# Altium schematic symbol library MCU_ST_STM32F4.SchLib: 300 symbols (part 3 of 10)
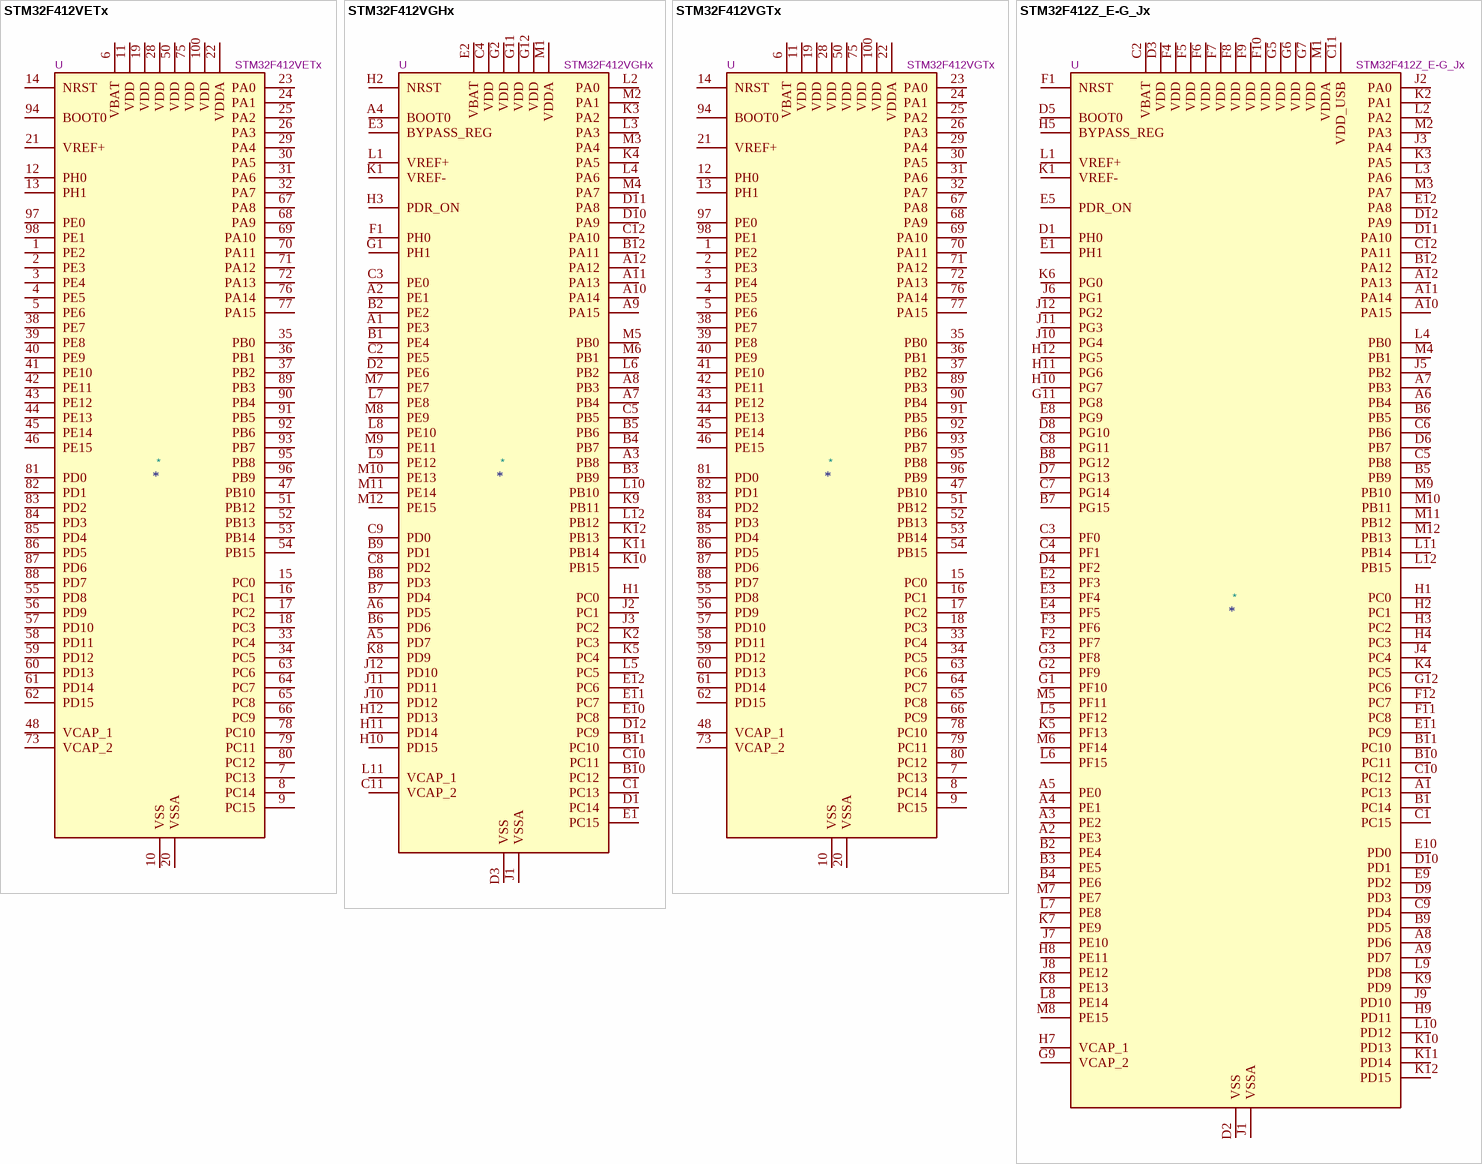
[diagram p78: symbols STM32F412VETx to STM32F412Z_E-G_Jx]

## STM32F412Z_E-G_Jx
designator *  value STM32F412Z_E-G_Jx  Reference: U
ki_keywords: Arm Cortex-M4 STM32F4 STM32F412; ki_description: STMicroelectronics Arm Cortex-M4 MCU, 512-1024KB flash, 256KB RAM, 100 MHz, 1.7-3.6V, 114 GPIO, UFBGA144; ki_fp_filters: *UFBGA*10x10mm*Layout12x12*P0.8mm*; Footprint: Package_BGA:UFBGA-144_10x10mm_Layout12x12_P0.8mm; Datasheet: https://www.st.com/resource/en/datasheet/stm32f412ze.pdf
pins: A1 PC13, A2 PE3, A3 PE2, A4 PE1, A5 PE0, A6 PB4, A7 PB3, A8 PD6, A9 PD7, A10 PA15, A11 PA14, A12 PA13, B1 PC14, B2 PE4, B3 PE5, B4 PE6, B5 PB9, B6 PB5, B7 PG15, B8 PG12, B9 PD5, B10 PC11, B11 PC10, B12 PA12, C1 PC15, C2 VBAT, C3 PF0, C4 PF1, C5 PB8, C6 PB6, C7 PG14, C8 PG11, C9 PD4, C10 PC12, C11 VDD_USB, C12 PA11, D1 PH0, D2 VSS, D3 VDD, D4 PF2, D5 BOOT0, D6 PB7, D7 PG13, D8 PG10, D9 PD3, D10 PD1, D11 PA10, D12 PA9, E1 PH1, E2 PF3, E3 PF4, E4 PF5, E5 PDR_ON, E6 VSS hidden, E7 VSS hidden, E8 PG9, E9 PD2, E10 PD0, E11 PC9, E12 PA8, F1 NRST, F2 PF7, F3 PF6, F4 VDD, F5 VDD, F6 VDD, F7 VDD, F8 VDD, F9 VDD, F10 VDD, F11 PC8, F12 PC7, G1 PF10, G2 PF9, G3 PF8, G4 VSS hidden, G5 VDD, G6 VDD, G7 VDD, G8 VSS hidden, G9 VCAP_2, G10 VSS hidden, G11 PG8, G12 PC6, H1 PC0, H2 PC1, H3 PC2, H4 PC3, H5 BYPASS_REG, H6 VSS hidden, H7 VCAP_1, H8 PE11, H9 PD11, H10 PG7, H11 PG6, H12 PG5, J1 VSSA, J2 PA0, J3 PA4, J4 PC4, J5 PB2, J6 PG1, J7 PE10, J8 PE12, J9 PD10, J10 PG4, J11 PG3, J12 PG2, K1 VREF-, K2 PA1, K3 PA5, K4 PC5, K5 PF13, K6 PG0, K7 PE9, K8 PE13, K9 PD9, K10 PD13, K11 PD14, K12 PD15, L1 VREF+, L2 PA2, L3 PA6, L4 PB0, L5 PF12, L6 PF15, L7 PE8, L8 PE14, L9 PD8, L10 PD12, L11 PB14, L12 PB15, M1 VDDA, M2 PA3, M3 PA7, M4 PB1, M5 PF11, M6 PF14, M7 PE7, M8 PE15, M9 PB10, M10 PB11, M11 PB12, M12 PB13

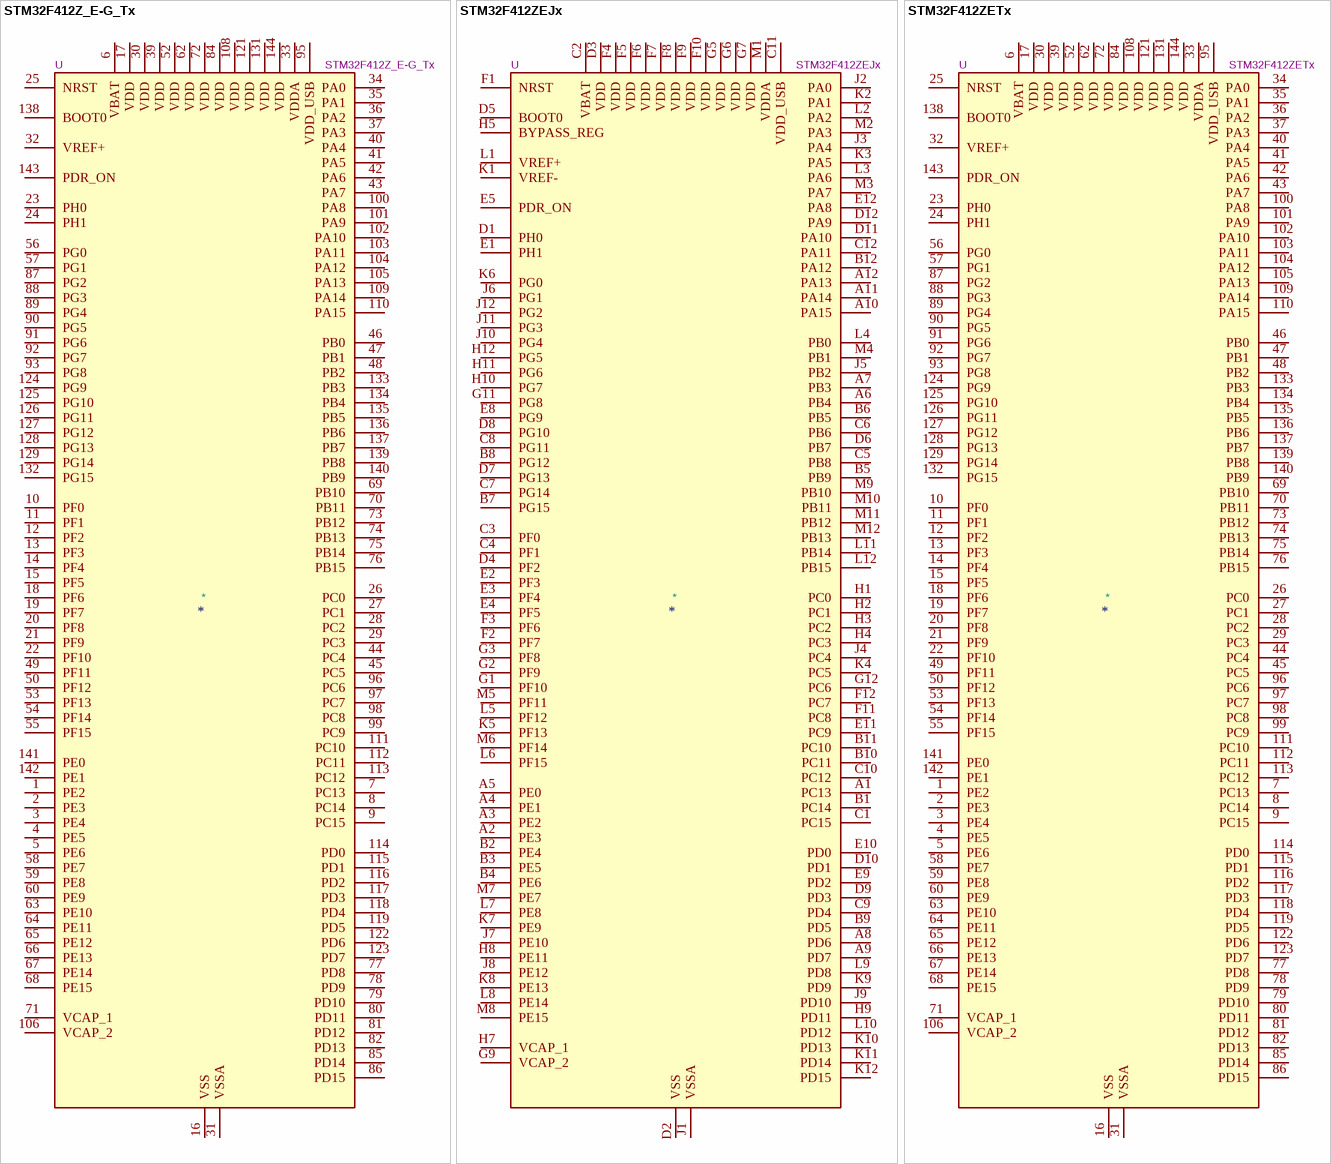
[diagram p16: symbols STM32F412Z_E-G_Tx to STM32F412ZETx]

## STM32F412Z_E-G_Tx
designator *  value STM32F412Z_E-G_Tx  Reference: U
ki_keywords: Arm Cortex-M4 STM32F4 STM32F412; ki_description: STMicroelectronics Arm Cortex-M4 MCU, 512-1024KB flash, 256KB RAM, 100 MHz, 1.7-3.6V, 114 GPIO, LQFP144; ki_fp_filters: LQFP*20x20mm*P0.5mm*; Footprint: Package_QFP:LQFP-144_20x20mm_P0.5mm; Datasheet: https://www.st.com/resource/en/datasheet/stm32f412ze.pdf
pins: 1 PE2, 2 PE3, 3 PE4, 4 PE5, 5 PE6, 6 VBAT, 7 PC13, 8 PC14, 9 PC15, 10 PF0, 11 PF1, 12 PF2, 13 PF3, 14 PF4, 15 PF5, 16 VSS, 17 VDD, 18 PF6, 19 PF7, 20 PF8, 21 PF9, 22 PF10, 23 PH0, 24 PH1, 25 NRST, 26 PC0, 27 PC1, 28 PC2, 29 PC3, 30 VDD, 31 VSSA, 32 VREF+, 33 VDDA, 34 PA0, 35 PA1, 36 PA2, 37 PA3, 38 VSS hidden, 39 VDD, 40 PA4, 41 PA5, 42 PA6, 43 PA7, 44 PC4, 45 PC5, 46 PB0, 47 PB1, 48 PB2, 49 PF11, 50 PF12, 51 VSS hidden, 52 VDD, 53 PF13, 54 PF14, 55 PF15, 56 PG0, 57 PG1, 58 PE7, 59 PE8, 60 PE9, 61 VSS hidden, 62 VDD, 63 PE10, 64 PE11, 65 PE12, 66 PE13, 67 PE14, 68 PE15, 69 PB10, 70 PB11, 71 VCAP_1, 72 VDD, 73 PB12, 74 PB13, 75 PB14, 76 PB15, 77 PD8, 78 PD9, 79 PD10, 80 PD11, 81 PD12, 82 PD13, 83 VSS hidden, 84 VDD, 85 PD14, 86 PD15, 87 PG2, 88 PG3, 89 PG4, 90 PG5, 91 PG6, 92 PG7, 93 PG8, 94 VSS hidden, 95 VDD_USB, 96 PC6, 97 PC7, 98 PC8, 99 PC9, 100 PA8, 101 PA9, 102 PA10, 103 PA11, 104 PA12, 105 PA13, 106 VCAP_2, 107 VSS hidden, 108 VDD, 109 PA14, 110 PA15, 111 PC10, 112 PC11, 113 PC12, 114 PD0, 115 PD1, 116 PD2, 117 PD3, 118 PD4, 119 PD5, 120 VSS hidden, 121 VDD, 122 PD6, 123 PD7, 124 PG9, 125 PG10, 126 PG11, 127 PG12, 128 PG13, 129 PG14, 130 VSS hidden, 131 VDD, 132 PG15, 133 PB3, 134 PB4, 135 PB5, 136 PB6, 137 PB7, 138 BOOT0, 139 PB8, 140 PB9, 141 PE0, 142 PE1, 143 PDR_ON, 144 VDD

## STM32F412ZEJx
designator *  value STM32F412ZEJx  Reference: U
ki_keywords: Arm Cortex-M4 STM32F4 STM32F412; ki_description: STMicroelectronics Arm Cortex-M4 MCU, 512KB flash, 256KB RAM, 100 MHz, 1.7-3.6V, 114 GPIO, UFBGA144; ki_fp_filters: *UFBGA*10x10mm*Layout12x12*P0.8mm*; Footprint: Package_BGA:UFBGA-144_10x10mm_Layout12x12_P0.8mm; Datasheet: https://www.st.com/resource/en/datasheet/stm32f412ze.pdf
pins: A1 PC13, A2 PE3, A3 PE2, A4 PE1, A5 PE0, A6 PB4, A7 PB3, A8 PD6, A9 PD7, A10 PA15, A11 PA14, A12 PA13, B1 PC14, B2 PE4, B3 PE5, B4 PE6, B5 PB9, B6 PB5, B7 PG15, B8 PG12, B9 PD5, B10 PC11, B11 PC10, B12 PA12, C1 PC15, C2 VBAT, C3 PF0, C4 PF1, C5 PB8, C6 PB6, C7 PG14, C8 PG11, C9 PD4, C10 PC12, C11 VDD_USB, C12 PA11, D1 PH0, D2 VSS, D3 VDD, D4 PF2, D5 BOOT0, D6 PB7, D7 PG13, D8 PG10, D9 PD3, D10 PD1, D11 PA10, D12 PA9, E1 PH1, E2 PF3, E3 PF4, E4 PF5, E5 PDR_ON, E6 VSS hidden, E7 VSS hidden, E8 PG9, E9 PD2, E10 PD0, E11 PC9, E12 PA8, F1 NRST, F2 PF7, F3 PF6, F4 VDD, F5 VDD, F6 VDD, F7 VDD, F8 VDD, F9 VDD, F10 VDD, F11 PC8, F12 PC7, G1 PF10, G2 PF9, G3 PF8, G4 VSS hidden, G5 VDD, G6 VDD, G7 VDD, G8 VSS hidden, G9 VCAP_2, G10 VSS hidden, G11 PG8, G12 PC6, H1 PC0, H2 PC1, H3 PC2, H4 PC3, H5 BYPASS_REG, H6 VSS hidden, H7 VCAP_1, H8 PE11, H9 PD11, H10 PG7, H11 PG6, H12 PG5, J1 VSSA, J2 PA0, J3 PA4, J4 PC4, J5 PB2, J6 PG1, J7 PE10, J8 PE12, J9 PD10, J10 PG4, J11 PG3, J12 PG2, K1 VREF-, K2 PA1, K3 PA5, K4 PC5, K5 PF13, K6 PG0, K7 PE9, K8 PE13, K9 PD9, K10 PD13, K11 PD14, K12 PD15, L1 VREF+, L2 PA2, L3 PA6, L4 PB0, L5 PF12, L6 PF15, L7 PE8, L8 PE14, L9 PD8, L10 PD12, L11 PB14, L12 PB15, M1 VDDA, M2 PA3, M3 PA7, M4 PB1, M5 PF11, M6 PF14, M7 PE7, M8 PE15, M9 PB10, M10 PB11, M11 PB12, M12 PB13

## STM32F412ZETx
designator *  value STM32F412ZETx  Reference: U
ki_keywords: Arm Cortex-M4 STM32F4 STM32F412; ki_description: STMicroelectronics Arm Cortex-M4 MCU, 512KB flash, 256KB RAM, 100 MHz, 1.7-3.6V, 114 GPIO, LQFP144; ki_fp_filters: LQFP*20x20mm*P0.5mm*; Footprint: Package_QFP:LQFP-144_20x20mm_P0.5mm; Datasheet: https://www.st.com/resource/en/datasheet/stm32f412ze.pdf
pins: 1 PE2, 2 PE3, 3 PE4, 4 PE5, 5 PE6, 6 VBAT, 7 PC13, 8 PC14, 9 PC15, 10 PF0, 11 PF1, 12 PF2, 13 PF3, 14 PF4, 15 PF5, 16 VSS, 17 VDD, 18 PF6, 19 PF7, 20 PF8, 21 PF9, 22 PF10, 23 PH0, 24 PH1, 25 NRST, 26 PC0, 27 PC1, 28 PC2, 29 PC3, 30 VDD, 31 VSSA, 32 VREF+, 33 VDDA, 34 PA0, 35 PA1, 36 PA2, 37 PA3, 38 VSS hidden, 39 VDD, 40 PA4, 41 PA5, 42 PA6, 43 PA7, 44 PC4, 45 PC5, 46 PB0, 47 PB1, 48 PB2, 49 PF11, 50 PF12, 51 VSS hidden, 52 VDD, 53 PF13, 54 PF14, 55 PF15, 56 PG0, 57 PG1, 58 PE7, 59 PE8, 60 PE9, 61 VSS hidden, 62 VDD, 63 PE10, 64 PE11, 65 PE12, 66 PE13, 67 PE14, 68 PE15, 69 PB10, 70 PB11, 71 VCAP_1, 72 VDD, 73 PB12, 74 PB13, 75 PB14, 76 PB15, 77 PD8, 78 PD9, 79 PD10, 80 PD11, 81 PD12, 82 PD13, 83 VSS hidden, 84 VDD, 85 PD14, 86 PD15, 87 PG2, 88 PG3, 89 PG4, 90 PG5, 91 PG6, 92 PG7, 93 PG8, 94 VSS hidden, 95 VDD_USB, 96 PC6, 97 PC7, 98 PC8, 99 PC9, 100 PA8, 101 PA9, 102 PA10, 103 PA11, 104 PA12, 105 PA13, 106 VCAP_2, 107 VSS hidden, 108 VDD, 109 PA14, 110 PA15, 111 PC10, 112 PC11, 113 PC12, 114 PD0, 115 PD1, 116 PD2, 117 PD3, 118 PD4, 119 PD5, 120 VSS hidden, 121 VDD, 122 PD6, 123 PD7, 124 PG9, 125 PG10, 126 PG11, 127 PG12, 128 PG13, 129 PG14, 130 VSS hidden, 131 VDD, 132 PG15, 133 PB3, 134 PB4, 135 PB5, 136 PB6, 137 PB7, 138 BOOT0, 139 PB8, 140 PB9, 141 PE0, 142 PE1, 143 PDR_ON, 144 VDD

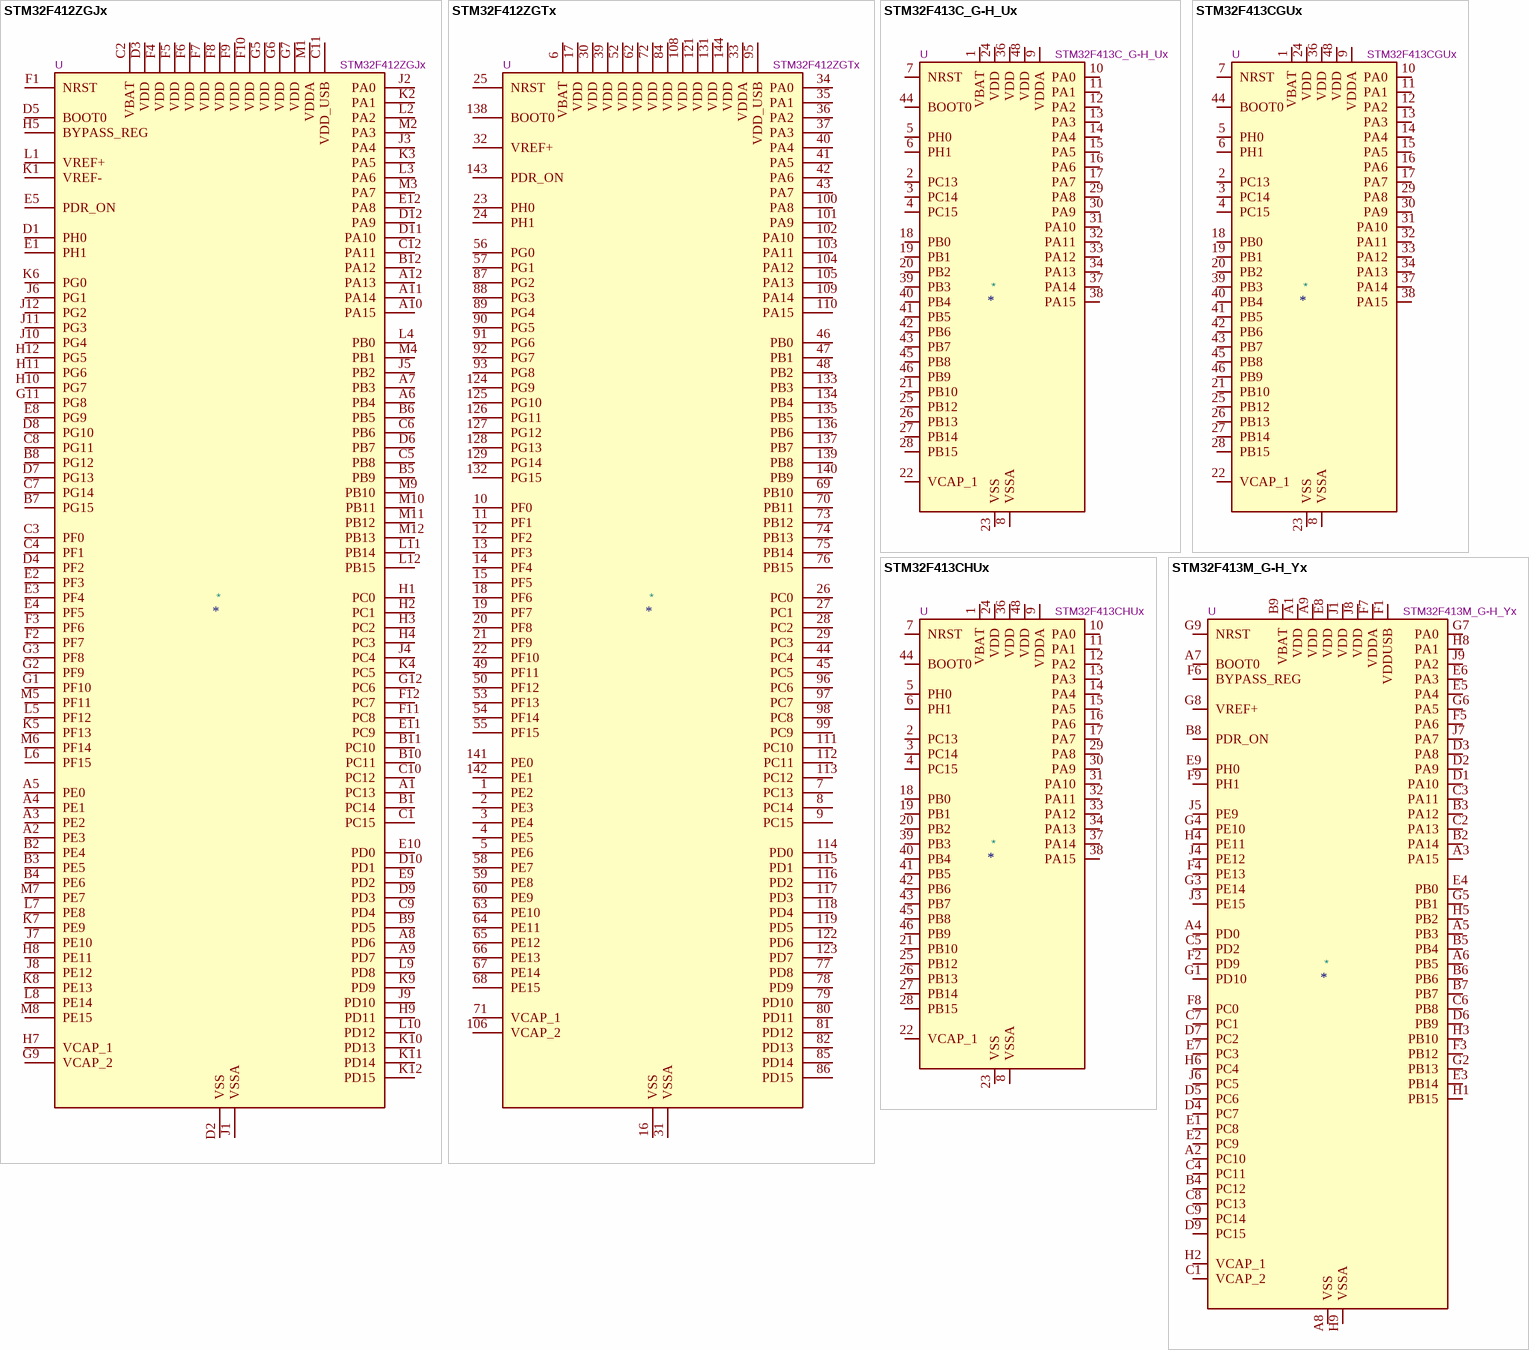
[diagram p17: symbols STM32F412ZGJx to STM32F413M_G-H_Yx]

## STM32F412ZGJx
designator *  value STM32F412ZGJx  Reference: U
ki_keywords: Arm Cortex-M4 STM32F4 STM32F412; ki_description: STMicroelectronics Arm Cortex-M4 MCU, 1024KB flash, 256KB RAM, 100 MHz, 1.7-3.6V, 114 GPIO, UFBGA144; ki_fp_filters: *UFBGA*10x10mm*Layout12x12*P0.8mm*; Footprint: Package_BGA:UFBGA-144_10x10mm_Layout12x12_P0.8mm; Datasheet: https://www.st.com/resource/en/datasheet/stm32f412zg.pdf
pins: A1 PC13, A2 PE3, A3 PE2, A4 PE1, A5 PE0, A6 PB4, A7 PB3, A8 PD6, A9 PD7, A10 PA15, A11 PA14, A12 PA13, B1 PC14, B2 PE4, B3 PE5, B4 PE6, B5 PB9, B6 PB5, B7 PG15, B8 PG12, B9 PD5, B10 PC11, B11 PC10, B12 PA12, C1 PC15, C2 VBAT, C3 PF0, C4 PF1, C5 PB8, C6 PB6, C7 PG14, C8 PG11, C9 PD4, C10 PC12, C11 VDD_USB, C12 PA11, D1 PH0, D2 VSS, D3 VDD, D4 PF2, D5 BOOT0, D6 PB7, D7 PG13, D8 PG10, D9 PD3, D10 PD1, D11 PA10, D12 PA9, E1 PH1, E2 PF3, E3 PF4, E4 PF5, E5 PDR_ON, E6 VSS hidden, E7 VSS hidden, E8 PG9, E9 PD2, E10 PD0, E11 PC9, E12 PA8, F1 NRST, F2 PF7, F3 PF6, F4 VDD, F5 VDD, F6 VDD, F7 VDD, F8 VDD, F9 VDD, F10 VDD, F11 PC8, F12 PC7, G1 PF10, G2 PF9, G3 PF8, G4 VSS hidden, G5 VDD, G6 VDD, G7 VDD, G8 VSS hidden, G9 VCAP_2, G10 VSS hidden, G11 PG8, G12 PC6, H1 PC0, H2 PC1, H3 PC2, H4 PC3, H5 BYPASS_REG, H6 VSS hidden, H7 VCAP_1, H8 PE11, H9 PD11, H10 PG7, H11 PG6, H12 PG5, J1 VSSA, J2 PA0, J3 PA4, J4 PC4, J5 PB2, J6 PG1, J7 PE10, J8 PE12, J9 PD10, J10 PG4, J11 PG3, J12 PG2, K1 VREF-, K2 PA1, K3 PA5, K4 PC5, K5 PF13, K6 PG0, K7 PE9, K8 PE13, K9 PD9, K10 PD13, K11 PD14, K12 PD15, L1 VREF+, L2 PA2, L3 PA6, L4 PB0, L5 PF12, L6 PF15, L7 PE8, L8 PE14, L9 PD8, L10 PD12, L11 PB14, L12 PB15, M1 VDDA, M2 PA3, M3 PA7, M4 PB1, M5 PF11, M6 PF14, M7 PE7, M8 PE15, M9 PB10, M10 PB11, M11 PB12, M12 PB13

## STM32F412ZGTx
designator *  value STM32F412ZGTx  Reference: U
ki_keywords: Arm Cortex-M4 STM32F4 STM32F412; ki_description: STMicroelectronics Arm Cortex-M4 MCU, 1024KB flash, 256KB RAM, 100 MHz, 1.7-3.6V, 114 GPIO, LQFP144; ki_fp_filters: LQFP*20x20mm*P0.5mm*; Footprint: Package_QFP:LQFP-144_20x20mm_P0.5mm; Datasheet: https://www.st.com/resource/en/datasheet/stm32f412zg.pdf
pins: 1 PE2, 2 PE3, 3 PE4, 4 PE5, 5 PE6, 6 VBAT, 7 PC13, 8 PC14, 9 PC15, 10 PF0, 11 PF1, 12 PF2, 13 PF3, 14 PF4, 15 PF5, 16 VSS, 17 VDD, 18 PF6, 19 PF7, 20 PF8, 21 PF9, 22 PF10, 23 PH0, 24 PH1, 25 NRST, 26 PC0, 27 PC1, 28 PC2, 29 PC3, 30 VDD, 31 VSSA, 32 VREF+, 33 VDDA, 34 PA0, 35 PA1, 36 PA2, 37 PA3, 38 VSS hidden, 39 VDD, 40 PA4, 41 PA5, 42 PA6, 43 PA7, 44 PC4, 45 PC5, 46 PB0, 47 PB1, 48 PB2, 49 PF11, 50 PF12, 51 VSS hidden, 52 VDD, 53 PF13, 54 PF14, 55 PF15, 56 PG0, 57 PG1, 58 PE7, 59 PE8, 60 PE9, 61 VSS hidden, 62 VDD, 63 PE10, 64 PE11, 65 PE12, 66 PE13, 67 PE14, 68 PE15, 69 PB10, 70 PB11, 71 VCAP_1, 72 VDD, 73 PB12, 74 PB13, 75 PB14, 76 PB15, 77 PD8, 78 PD9, 79 PD10, 80 PD11, 81 PD12, 82 PD13, 83 VSS hidden, 84 VDD, 85 PD14, 86 PD15, 87 PG2, 88 PG3, 89 PG4, 90 PG5, 91 PG6, 92 PG7, 93 PG8, 94 VSS hidden, 95 VDD_USB, 96 PC6, 97 PC7, 98 PC8, 99 PC9, 100 PA8, 101 PA9, 102 PA10, 103 PA11, 104 PA12, 105 PA13, 106 VCAP_2, 107 VSS hidden, 108 VDD, 109 PA14, 110 PA15, 111 PC10, 112 PC11, 113 PC12, 114 PD0, 115 PD1, 116 PD2, 117 PD3, 118 PD4, 119 PD5, 120 VSS hidden, 121 VDD, 122 PD6, 123 PD7, 124 PG9, 125 PG10, 126 PG11, 127 PG12, 128 PG13, 129 PG14, 130 VSS hidden, 131 VDD, 132 PG15, 133 PB3, 134 PB4, 135 PB5, 136 PB6, 137 PB7, 138 BOOT0, 139 PB8, 140 PB9, 141 PE0, 142 PE1, 143 PDR_ON, 144 VDD

## STM32F413C_G-H_Ux
designator *  value STM32F413C_G-H_Ux  Reference: U
ki_keywords: Arm Cortex-M4 STM32F4 STM32F413/423; ki_description: STMicroelectronics Arm Cortex-M4 MCU, 1024-1536KB flash, 320KB RAM, 100 MHz, 1.7-3.6V, 36 GPIO, UFQFPN48; ki_fp_filters: QFN*1EP*7x7mm*P0.5mm*; Footprint: Package_DFN_QFN:QFN-48-1EP_7x7mm_P0.5mm_EP5.6x5.6mm; Datasheet: https://www.st.com/resource/en/datasheet/stm32f413cg.pdf
pins: 1 VBAT, 2 PC13, 3 PC14, 4 PC15, 5 PH0, 6 PH1, 7 NRST, 8 VSSA, 9 VDDA, 10 PA0, 11 PA1, 12 PA2, 13 PA3, 14 PA4, 15 PA5, 16 PA6, 17 PA7, 18 PB0, 19 PB1, 20 PB2, 21 PB10, 22 VCAP_1, 23 VSS, 24 VDD, 25 PB12, 26 PB13, 27 PB14, 28 PB15, 29 PA8, 30 PA9, 31 PA10, 32 PA11, 33 PA12, 34 PA13, 35 VSS hidden, 36 VDD, 37 PA14, 38 PA15, 39 PB3, 40 PB4, 41 PB5, 42 PB6, 43 PB7, 44 BOOT0, 45 PB8, 46 PB9, 47 VSS hidden, 48 VDD, 49 VSS hidden

## STM32F413CGUx
designator *  value STM32F413CGUx  Reference: U
ki_keywords: Arm Cortex-M4 STM32F4 STM32F413/423; ki_description: STMicroelectronics Arm Cortex-M4 MCU, 1024KB flash, 320KB RAM, 100 MHz, 1.7-3.6V, 36 GPIO, UFQFPN48; ki_fp_filters: QFN*1EP*7x7mm*P0.5mm*; Footprint: Package_DFN_QFN:QFN-48-1EP_7x7mm_P0.5mm_EP5.6x5.6mm; Datasheet: https://www.st.com/resource/en/datasheet/stm32f413cg.pdf
pins: 1 VBAT, 2 PC13, 3 PC14, 4 PC15, 5 PH0, 6 PH1, 7 NRST, 8 VSSA, 9 VDDA, 10 PA0, 11 PA1, 12 PA2, 13 PA3, 14 PA4, 15 PA5, 16 PA6, 17 PA7, 18 PB0, 19 PB1, 20 PB2, 21 PB10, 22 VCAP_1, 23 VSS, 24 VDD, 25 PB12, 26 PB13, 27 PB14, 28 PB15, 29 PA8, 30 PA9, 31 PA10, 32 PA11, 33 PA12, 34 PA13, 35 VSS hidden, 36 VDD, 37 PA14, 38 PA15, 39 PB3, 40 PB4, 41 PB5, 42 PB6, 43 PB7, 44 BOOT0, 45 PB8, 46 PB9, 47 VSS hidden, 48 VDD, 49 VSS hidden

## STM32F413CHUx
designator *  value STM32F413CHUx  Reference: U
ki_keywords: Arm Cortex-M4 STM32F4 STM32F413/423; ki_description: STMicroelectronics Arm Cortex-M4 MCU, 1536KB flash, 320KB RAM, 100 MHz, 1.7-3.6V, 36 GPIO, UFQFPN48; ki_fp_filters: QFN*1EP*7x7mm*P0.5mm*; Footprint: Package_DFN_QFN:QFN-48-1EP_7x7mm_P0.5mm_EP5.6x5.6mm; Datasheet: https://www.st.com/resource/en/datasheet/stm32f413ch.pdf
pins: 1 VBAT, 2 PC13, 3 PC14, 4 PC15, 5 PH0, 6 PH1, 7 NRST, 8 VSSA, 9 VDDA, 10 PA0, 11 PA1, 12 PA2, 13 PA3, 14 PA4, 15 PA5, 16 PA6, 17 PA7, 18 PB0, 19 PB1, 20 PB2, 21 PB10, 22 VCAP_1, 23 VSS, 24 VDD, 25 PB12, 26 PB13, 27 PB14, 28 PB15, 29 PA8, 30 PA9, 31 PA10, 32 PA11, 33 PA12, 34 PA13, 35 VSS hidden, 36 VDD, 37 PA14, 38 PA15, 39 PB3, 40 PB4, 41 PB5, 42 PB6, 43 PB7, 44 BOOT0, 45 PB8, 46 PB9, 47 VSS hidden, 48 VDD, 49 VSS hidden

## STM32F413M_G-H_Yx
designator *  value STM32F413M_G-H_Yx  Reference: U
ki_keywords: Arm Cortex-M4 STM32F4 STM32F413/423; ki_description: STMicroelectronics Arm Cortex-M4 MCU, 1024-1536KB flash, 320KB RAM, 100 MHz, 1.7-3.6V, 60 GPIO, WLCSP81; ki_fp_filters: ST*WLCSP*Die463*; Footprint: Package_CSP:ST_WLCSP-81_Die463; Datasheet: https://www.st.com/resource/en/datasheet/stm32f413mg.pdf
pins: A1 VDD, A2 PC10, A3 PA15, A4 PD0, A5 PB3, A6 PB5, A7 BOOT0, A8 VSS, A9 VDD, B1 VSS hidden, B2 PA14, B3 PA12, B4 PC12, B5 PB4, B6 PB6, B7 PB7, B8 PDR_ON, B9 VBAT, C1 VCAP_2, C2 PA13, C3 PA11, C4 PC11, C5 PD2, C6 PB8, C7 PC1, C8 PC13, C9 PC14, D1 PA10, D2 PA9, D3 PA8, D4 PC7, D5 PC6, D6 PB9, D7 PC2, D8 VSS hidden, D9 PC15, E1 PC8, E2 PC9, E3 PB14, E4 PB0, E5 PA4, E6 PA3, E7 PC3, E8 VDD, E9 PH0, F1 VDDUSB, F2 PD9, F3 PB12, F4 PE13, F5 PA6, F6 BYPASS_REG, F7 VDDA, F8 PC0, F9 PH1, G1 PD10, G2 PB13, G3 PE14, G4 PE10, G5 PB1, G6 PA5, G7 PA0, G8 VREF+, G9 NRST, H1 PB15, H2 VCAP_1, H3 PB10, H4 PE11, H5 PB2, H6 PC4, H7 VSS hidden, H8 PA1, H9 VSSA, J1 VDD, J2 VSS hidden, J3 PE15, J4 PE12, J5 PE9, J6 PC5, J7 PA7, J8 VDD, J9 PA2

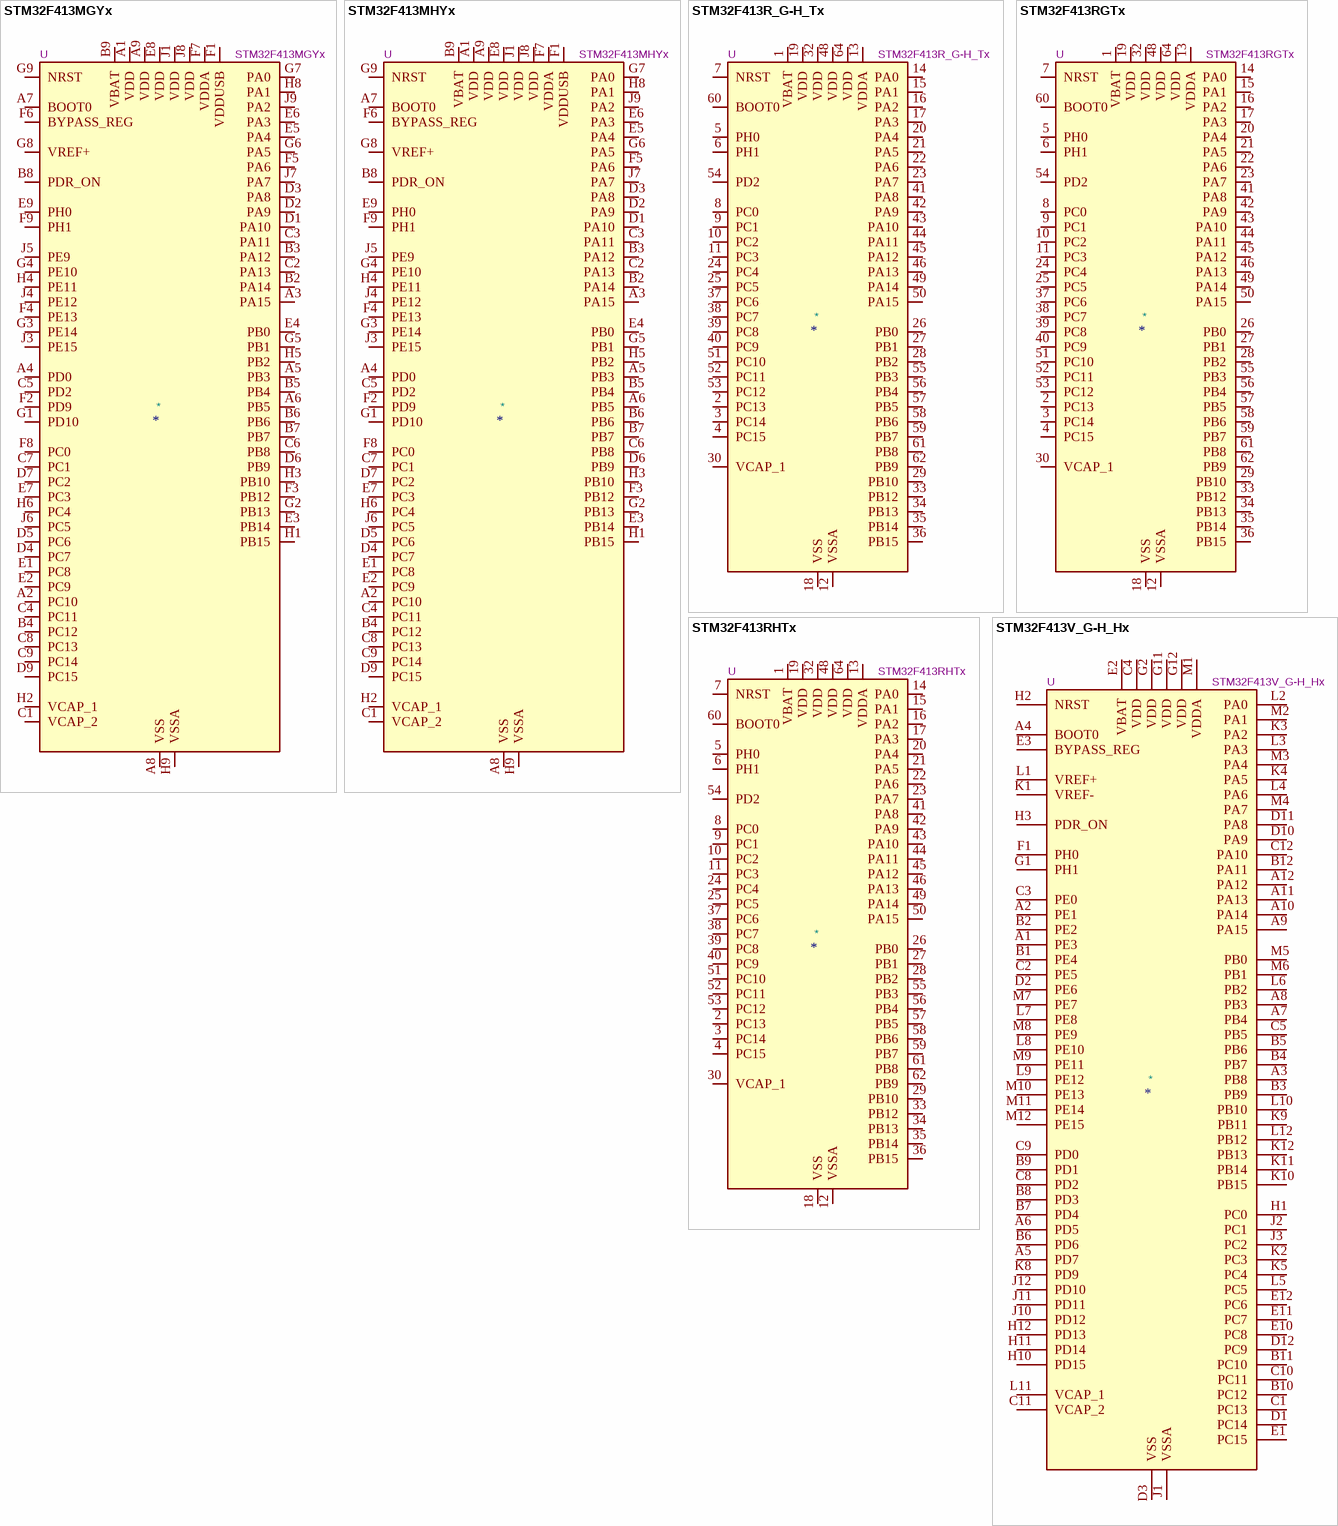
[diagram p18: symbols STM32F413MGYx to STM32F413V_G-H_Hx]

## STM32F413MGYx
designator *  value STM32F413MGYx  Reference: U
ki_keywords: Arm Cortex-M4 STM32F4 STM32F413/423; ki_description: STMicroelectronics Arm Cortex-M4 MCU, 1024KB flash, 320KB RAM, 100 MHz, 1.7-3.6V, 60 GPIO, WLCSP81; ki_fp_filters: ST*WLCSP*Die463*; Footprint: Package_CSP:ST_WLCSP-81_Die463; Datasheet: https://www.st.com/resource/en/datasheet/stm32f413mg.pdf
pins: A1 VDD, A2 PC10, A3 PA15, A4 PD0, A5 PB3, A6 PB5, A7 BOOT0, A8 VSS, A9 VDD, B1 VSS hidden, B2 PA14, B3 PA12, B4 PC12, B5 PB4, B6 PB6, B7 PB7, B8 PDR_ON, B9 VBAT, C1 VCAP_2, C2 PA13, C3 PA11, C4 PC11, C5 PD2, C6 PB8, C7 PC1, C8 PC13, C9 PC14, D1 PA10, D2 PA9, D3 PA8, D4 PC7, D5 PC6, D6 PB9, D7 PC2, D8 VSS hidden, D9 PC15, E1 PC8, E2 PC9, E3 PB14, E4 PB0, E5 PA4, E6 PA3, E7 PC3, E8 VDD, E9 PH0, F1 VDDUSB, F2 PD9, F3 PB12, F4 PE13, F5 PA6, F6 BYPASS_REG, F7 VDDA, F8 PC0, F9 PH1, G1 PD10, G2 PB13, G3 PE14, G4 PE10, G5 PB1, G6 PA5, G7 PA0, G8 VREF+, G9 NRST, H1 PB15, H2 VCAP_1, H3 PB10, H4 PE11, H5 PB2, H6 PC4, H7 VSS hidden, H8 PA1, H9 VSSA, J1 VDD, J2 VSS hidden, J3 PE15, J4 PE12, J5 PE9, J6 PC5, J7 PA7, J8 VDD, J9 PA2

## STM32F413MHYx
designator *  value STM32F413MHYx  Reference: U
ki_keywords: Arm Cortex-M4 STM32F4 STM32F413/423; ki_description: STMicroelectronics Arm Cortex-M4 MCU, 1536KB flash, 320KB RAM, 100 MHz, 1.7-3.6V, 60 GPIO, WLCSP81; ki_fp_filters: ST*WLCSP*Die463*; Footprint: Package_CSP:ST_WLCSP-81_Die463; Datasheet: https://www.st.com/resource/en/datasheet/stm32f413mh.pdf
pins: A1 VDD, A2 PC10, A3 PA15, A4 PD0, A5 PB3, A6 PB5, A7 BOOT0, A8 VSS, A9 VDD, B1 VSS hidden, B2 PA14, B3 PA12, B4 PC12, B5 PB4, B6 PB6, B7 PB7, B8 PDR_ON, B9 VBAT, C1 VCAP_2, C2 PA13, C3 PA11, C4 PC11, C5 PD2, C6 PB8, C7 PC1, C8 PC13, C9 PC14, D1 PA10, D2 PA9, D3 PA8, D4 PC7, D5 PC6, D6 PB9, D7 PC2, D8 VSS hidden, D9 PC15, E1 PC8, E2 PC9, E3 PB14, E4 PB0, E5 PA4, E6 PA3, E7 PC3, E8 VDD, E9 PH0, F1 VDDUSB, F2 PD9, F3 PB12, F4 PE13, F5 PA6, F6 BYPASS_REG, F7 VDDA, F8 PC0, F9 PH1, G1 PD10, G2 PB13, G3 PE14, G4 PE10, G5 PB1, G6 PA5, G7 PA0, G8 VREF+, G9 NRST, H1 PB15, H2 VCAP_1, H3 PB10, H4 PE11, H5 PB2, H6 PC4, H7 VSS hidden, H8 PA1, H9 VSSA, J1 VDD, J2 VSS hidden, J3 PE15, J4 PE12, J5 PE9, J6 PC5, J7 PA7, J8 VDD, J9 PA2
